# Altium footprint library ATROTECH.PcbLib: 334 footprints (part 15 of 21)
Each footprint in its own frame and in the unit in brackets; x right, y up, seen from the top. Pads: shape width x height; smd on the part's side, far side on the other; paste and mask are expansions set on the pad; w line width, h text height; cw(c..) or ccw(c..) is an arc to the next point about the centre after c.
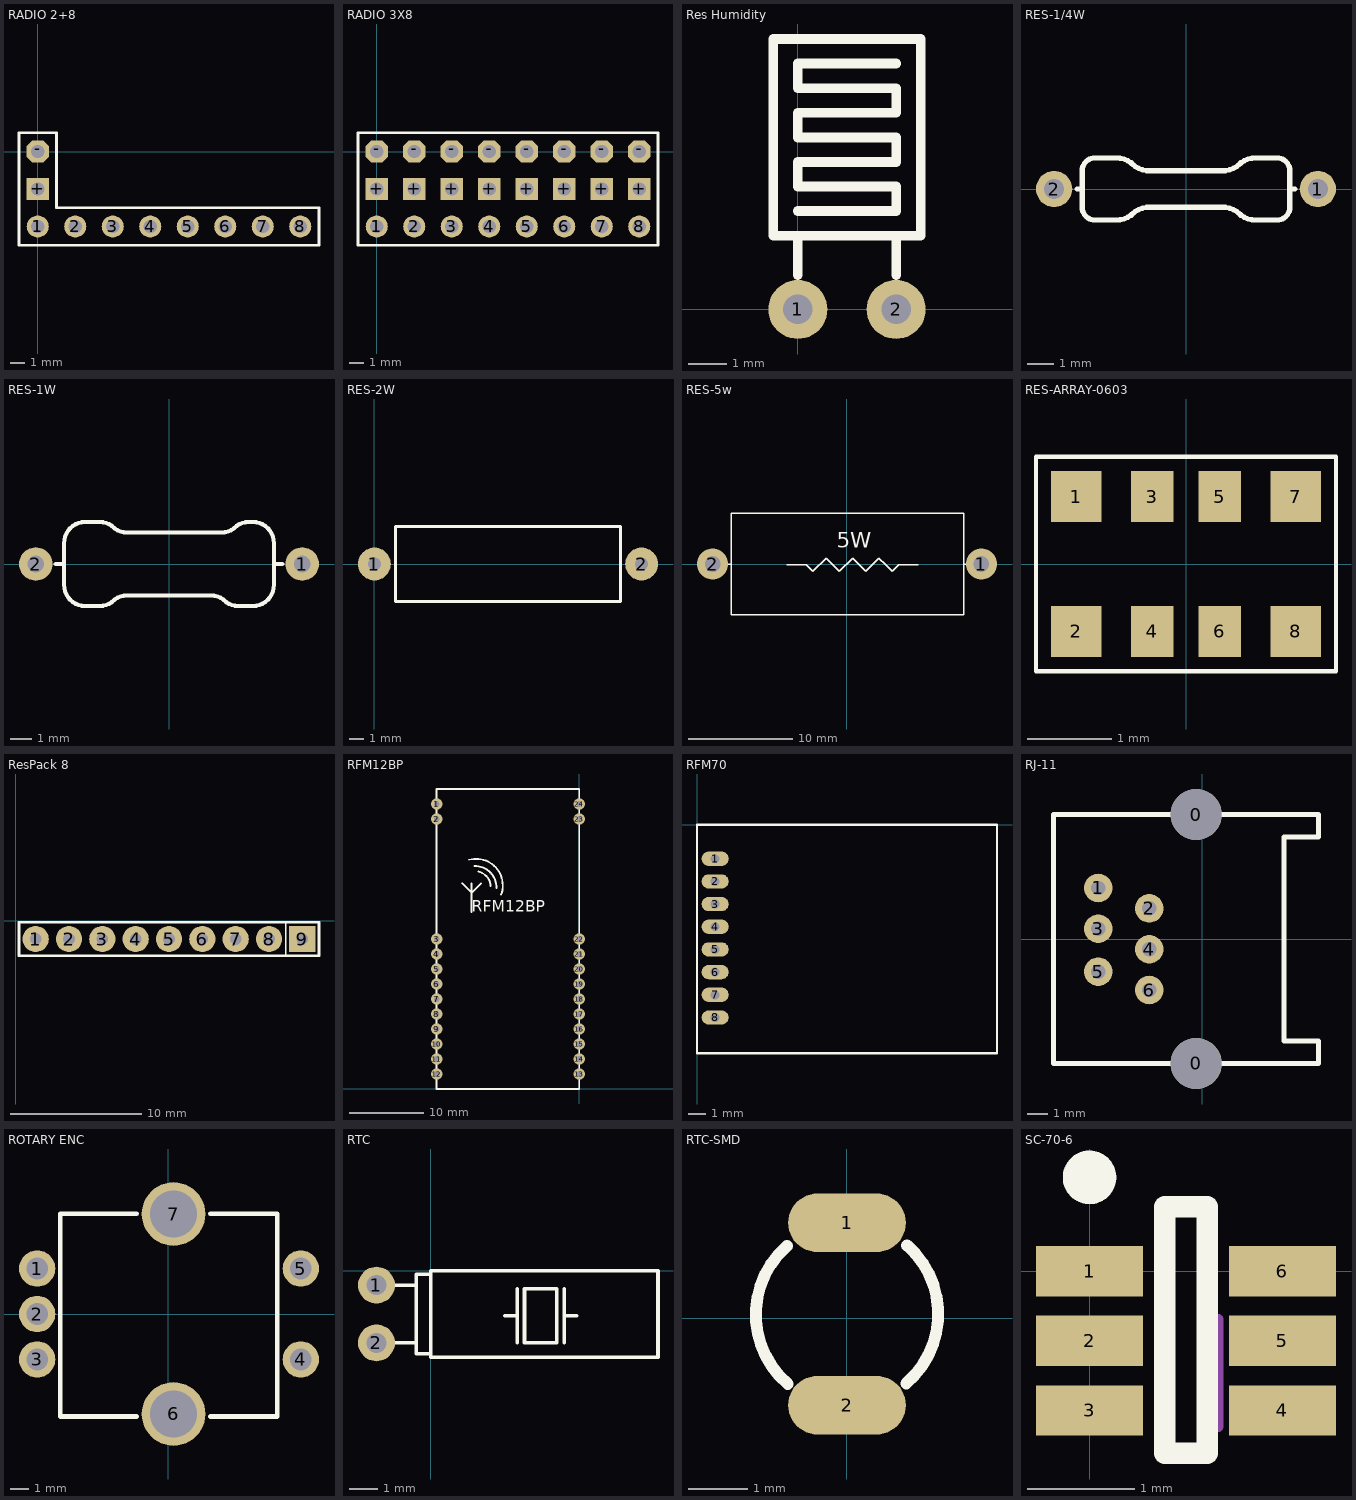
[diagram p14: the footprints below, top view; thin cyan lines are the x and y axes]

## RADIO 2+8 [mm]
pads (10):
  round 1.5 hole 0.9: 1(0,-5.08) 2(2.54,-5.08) 3(5.08,-5.08) 4(7.62,-5.08) 5(10.16,-5.08) 6(12.7,-5.08) 7(15.24,-5.08) 8(17.78,-5.08)
  rect 1.5x1.5 hole 0.9: +(0,-2.54)
  oct 1.5x1.5 hole 0.9: -(0,0)
Top Overlay:
  lines w0.2: -1.27,-6.35 19.05,-6.35 19.05,-3.81 1.27,-3.81 1.27,1.27 -1.27,1.27 -1.27,-6.35

## RADIO 3X8 [mm]
pads (24):
  round 1.5 hole 0.9: 1(0,-5.08) 2(2.54,-5.08) 3(5.08,-5.08) 4(7.62,-5.08) 5(10.16,-5.08) 6(12.7,-5.08) 7(15.24,-5.08) 8(17.78,-5.08)
  rect 1.5x1.5 hole 0.9: +(0,-2.54) +(2.54,-2.54) +(5.08,-2.54) +(7.62,-2.54) +(10.16,-2.54) +(12.7,-2.54) +(15.24,-2.54) +(17.78,-2.54)
  oct 1.5x1.5 hole 0.9: -(0,0) -(2.54,0) -(5.08,0) -(7.62,0) -(10.16,0) -(12.7,0) -(15.24,0) -(17.78,0)
Top Overlay:
  lines w0.2: -1.27,-6.35 -1.27,1.27 19.05,1.27 19.05,-6.35 -1.27,-6.35

## Res Humidity [mil]
pads (2):
  round 60 hole 30: 1(0,0) 2(100,0)
Top Overlay:
  lines w10: 0,35 0,75 ; 0,100 100,100 100,125 0,125 0,150 100,150 100,175 0,175 0,200 100,200 100,225 0,225 0,250 100,250 ; 100,35 100,75 ; -25,75 125,75 125,275 -25,275 -25,75

## RES-1/4W [mil]
pads (2):
  round 55 hole 30: 1(200,0) 2(-200,0)
Top Overlay:
  lines w7.87: -212.6,0 -196.85,0 ; -165.35,0 -157.48,0 ; -82.96,-39.09 cw(c-55.12,-66.93) -59.47,-27.8 59.47,-27.8 cw(c55.12,-66.93) 82.96,-39.09 ; -82.96,39.09 ccw(c-55.12,66.93) -59.47,27.8 59.47,27.8 ccw(c55.12,66.93) 82.96,39.09 ; -78.46,-35.71 cw(c-106.3,-7.88) -106.3,-47.24 -137.8,-47.24 cw(c-137.8,-27.56) -157.48,-27.56 -157.48,0 ; -78.46,35.71 ccw(c-106.3,7.88) -106.3,47.24 -137.8,47.24 ccw(c-137.8,27.56) -157.48,27.56 -157.48,0 ; 78.46,-35.71 ccw(c106.3,-7.88) 106.3,-47.24 137.8,-47.24 ccw(c137.8,-27.56) 157.48,-27.56 157.48,0 ; 78.46,35.71 cw(c106.3,7.88) 106.3,47.24 137.8,47.24 cw(c137.8,27.56) 157.48,27.56 157.48,0 ; 165.35,0 157.48,0
3D body "User Library-Res40-Axial 0_25W-2_7K.step": height 134.37, standoff -39.37, extent -211.81,-47.01 211.81,47.48

## RES-1W [mm]
pads (2):
  round 1.6 hole 0.8: 1(6.35,0) 2(-6.35,0)
Top Overlay:
  lines w0.2: -5.4,0 -5,0 ; -2.707,-1.793 cw(c-2,-2.5) -2,-1.5 -1.8,-1.5 1.8,-1.5 2,-1.5 cw(c2,-2.5) 2.707,-1.793 ; -2.707,1.793 ccw(c-2,2.5) -2,1.5 -1.8,1.5 1.8,1.5 2.5,1.5 ccw(c2.5,2.5) 3.207,1.793 ; -2.593,-1.707 cw(c-3.3,-1) -3.3,-2 -4,-2 cw(c-4,-1) -5,-1 -5,1 cw(c-4,1) -4,2 -3.3,2 cw(c-3.3,1) -2.593,1.707 ; 2.593,-1.707 ccw(c3.3,-1) 3.3,-2 4,-2 ccw(c4,-1) 5,-1 5,1 ccw(c4,1) 4,2 3.8,2 ccw(c3.8,1) 3.093,1.707 ; 5,0 5.4,0
3D body "Res_Normal (1W).STEP": height 3.83, standoff -2, extent -6.667,-1.829 6.668,1.829

## RES-2W [mm]
pads (2):
  round 2.2 hole 0.85: 1(0,0) 2(17.9,0)
Top Overlay:
  lines w0.2: 1.4,-2.5 16.5,-2.5 16.5,2.5 1.4,2.5 1.4,-2.5
3D body "Resistor_15R_to_Proteus.STEP": height 4.72, standoff -2.67, extent -0.285,-2.4 18.2,2.38

## RES-5w [mm]
height 9.51
pads (2):
  round 3 hole 1.5: 1(12.95,0) 2(-12.95,0)
Top Overlay:
  lines w0.127: -11.45,0 -11.2,0 ; -5.816,-0.074 -3.911,-0.074 -3.276,-0.709 -2.006,0.561 -0.736,-0.709 0.534,0.561 1.804,-0.709 3.074,0.561 3.709,-0.074 4.344,-0.709 4.979,-0.074 6.884,-0.074 ; 11.329,0 11.583,0 ; -11.15,-4.9 -11.15,4.9 11.25,4.9 11.25,-4.9 -11.15,-4.9
  text "5W" at -0.99,1.577 h1.52
3D body "User Library-SQP-5W.step": height 9.21, standoff -2.5, extent -13.15,-4.85 13.25,4.85

## RES-ARRAY-0603 [mm]
pads (8):
  rect 0.6x0.6 smd: 1(-1.3,0.8) 2(-1.3,-0.8) 7(1.3,0.8) 8(1.3,-0.8)
  rect 0.5x0.6 smd: 3(-0.4,0.8) 4(-0.4,-0.8) 5(0.4,0.8) 6(0.4,-0.8)
Top Overlay:
  lines w0.05: -1.778,-1.27 1.778,-1.27 1.778,1.27 -1.778,1.27 -1.778,-1.27
3D body "YC164_RESPACK.stp": height 0.61, standoff 0, extent -1.6,-0.762 1.6,0.838

## ResPack 8 [mm] "Parsa4"
pads (9):
  round 2 hole 0.9: 1(1.524,-1.397) 2(4.064,-1.397) 3(6.604,-1.397) 4(9.144,-1.397) 5(11.684,-1.397) 6(14.224,-1.397) 7(16.764,-1.397) 8(19.304,-1.397)
  rect 2x2 hole 0.9: 9(21.844,-1.397)
Top Overlay:
  lines w0.127: 20.574,-2.667 20.574,-0.127
  lines w0.2: 0.254,-2.667 0.254,-0.127 23.114,-0.127 23.114,-2.667 0.254,-2.667

## RFM12BP [mil] "RFM12BP FOOTPRINT"
height 196.85
pads (24):
  round 60 hole 30: 1(-748.03,1496.06) 2(-748.03,1417.32) 3(-748.03,787.4) 4(-748.03,708.66) 5(-748.03,629.92) 6(-748.03,551.18) 7(-748.03,472.44) 8(-748.03,393.7) 9(-748.03,314.96) 10(-748.03,236.22) 11(-748.03,157.48) 12(-748.03,78.74) 13(0,78.74) 14(0,157.48) 15(0,236.22) 16(0,314.96) 17(0,393.7) 18(0,472.44) 19(0,551.18) 20(0,629.92) 21(0,708.66) 22(0,787.4) 23(0,1417.32) 24(0,1496.06)
Top Overlay:
  lines w10: -615,1080 -565,1030 ; -579.08,1203.35 cw(c-541.46,1068.4) -410,1020 ; -565,930 -565,1030 ; -565,1080 -565,1030 ; -550,1170 cw(c-546,1059) -435,1055 ; -529.44,1141.47 cw(c-547.19,1061.12) -465,1065 ; -565,1030 -515,1080 -565,1030 ; -750,0 0,0 0,1575 -750,1575 -750,0
  text "RFM12BP" at -565,930 h60

## RFM70 [mm]
pads (8):
  oval 1.524x0.8 hole 0.5: 1(1.016,-1.905) 2(1.016,-3.175) 3(1.016,-4.445) 4(1.016,-5.715) 5(1.016,-6.985) 6(1.016,-8.255) 7(1.016,-9.525) 8(1.016,-10.795)
Top Overlay:
  lines w0.127: 0,-12.8 0,0 16.8,0 16.8,-12.8 0,-12.8

## RJ-11 [mm]
pads (8):
  round 2.5 hole 2.5: 0(-0.3,-6.1) 0(-0.3,6.1)
  round 1.4 hole 0.7: 1(-5.1,2.5) 2(-2.6,1.5) 3(-5.1,0.5) 4(-2.6,-0.5) 5(-5.1,-1.6) 6(-2.6,-2.5)
Top Overlay:
  lines w0.254: -7.3,-6.1 5.7,-6.1 5.7,-5 4,-5 4,5 5.7,5 5.7,6.1 -7.3,6.1 -7.3,-6.1
3D body "User Library-RJ11-WE-HOR-TAB-UP.step": height 14.5, standoff -3.5, extent -7.3,-7.2 5.7,7.2

## ROTARY ENC [mm] "ROTARY ENCODER"
pads (7):
  round 2 hole 1.2: 1(-7.2,2.516) 2(-7.2,0.016) 3(-7.2,-2.484) 4(7.3,-2.484) 5(7.3,2.516)
  round 3.5 hole 2.6: 6(0.3,-5.484) 7(0.3,5.516)
Top Overlay:
  lines w0.254: -1.739,-5.623 -5.93,-5.623 -5.93,5.528 -1.714,5.528 ; 2.325,-5.623 6,-5.623 6,5.528 2.325,5.528
3D body "12mm Incremental Encoder - BOURNS PEC11S.stp": height 31.5, standoff -6, extent -8.599,-8.571 8.596,8.619

## RTC [mm]
pads (2):
  round 1.3 hole 0.7: 1(-1.905,-0.508) 2(-1.905,-2.54)
Top Overlay:
  lines w0.127: -1.905,-2.54 -0.508,-2.54 ; -1.905,-0.508 -0.508,-0.508 ; 0,-3.048 8,-3.048 ; 0,-3 0,0 8,0 ; 0,-2.921 -0.508,-2.921 -0.508,-0.127 0,-0.127 ; 2.603,-1.587 3.048,-1.587 ; 3.048,-2.54 3.048,-0.635 ; 4.699,-2.54 4.699,-0.635 ; 4.699,-1.587 5.143,-1.587 ; 8.001,-3 8.001,0 ; 3.302,-2.54 3.302,-0.635 4.445,-0.635 4.445,-2.54 3.302,-2.54

## RTC-SMD [mm]
pads (2):
  oval 2x1 smd: 1(0,1.626) 2(0,-1.474)
Top Overlay:
  lines w0.2: -1.022,1.231 ccw(c0,0.066) -1.006,-1.113 ; 1.006,-1.103 ccw(c0,0.076) 1.022,1.241
3D body "Crystal TH.STEP": height 3.2, standoff 0, extent -1.713,-1.598 9.062,1.852

## SC-70-6 [mm]
pads (6):
  rect 1x0.47 smd: 1(0,0) 2(0,-0.65) 3(0,-1.3) 4(1.8,-1.3) 5(1.8,-0.65) 6(1.8,0)
Top Overlay:
  circle w0.25: c0,0.875 r0.125
  lines w0.2: 0.7,-1.7 0.7,0.6 1.1,0.6 1.1,-1.7 0.7,-1.7
Mechanical 15:
  lines w0.1: 1.2,-1.45 1.2,-0.45
3D body "User Library-SC70-6.step": height 0.92, standoff -0.03, extent -0.15,-1.65 1.95,0.35